# Altium integrated library WCAP-ATUL_rev15a.intlib: 117 symbols (part 1 of 2)
Pins are listed as number, name and electrical type; pins without a type are passive.

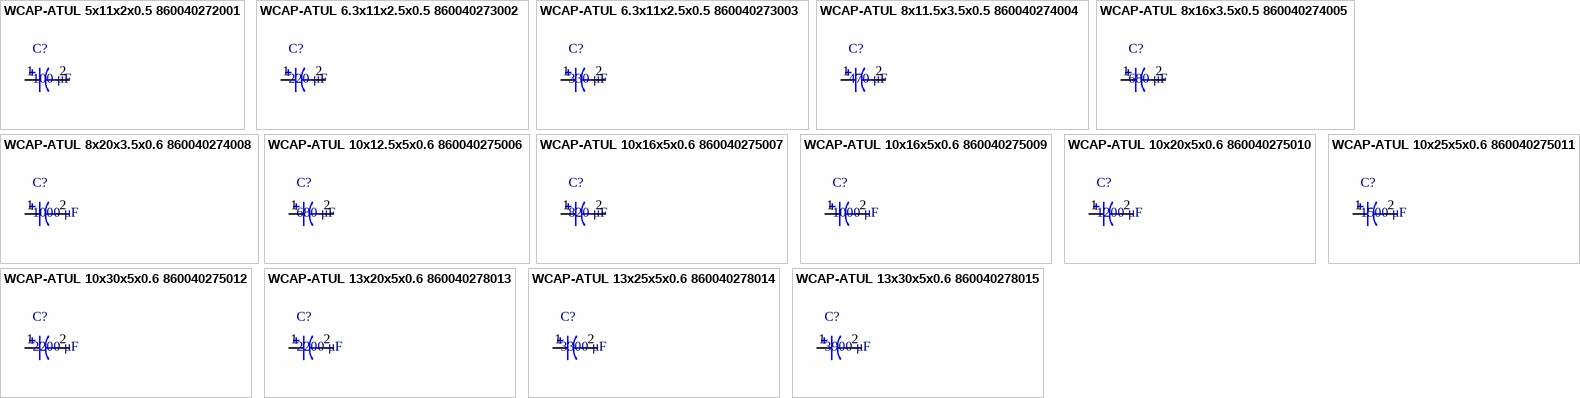
[diagram p0: symbols WCAP-ATUL 5x11x2x0.5 860040272001 to WCAP-ATUL 13x30x5x0.6 860040278015]

## WCAP-ATUL 5x11x2x0.5 860040272001
designator C?, comment 100 μF
WCAP-ATUL Aluminum Electrolytic Capacitors , 100 μF; + / - 20%; 10 V , 5 x 11; Manufacturer: Wurth Elektronik; partNo: 860040272001; E-mail: libraries@we-online.com; Characteristics: Aluminum Electrolytic Capacitor;Recommended soldering: Wave;Operating temperature: –40 °C to +105 °C;Minimized ESR and long life product series;Load life: 4000–10000 h @ +105 °C; ComponentLink1Description: Manufacturer; ComponentLink1URL: http://www.we-online.com; ComponentLink2Description: Datasheet; ComponentLink2URL: http://katalog.we-online.de/pbs/datasheet/860040272001.pdf; Created by: Karrer Zheng; Created Date: 5/13/2015; Capacitance: 100 μF; Application: Applied to high frequency secondary side output filter loop, general switching power supply, DC-DC converter, AC-DC converter, adapter, charger, TV, VCR, DC motor circuit filter, LCD TV digital audio, digital TV, digital camera, digital video camera, satellite receiver and etc.
footprint WCAP-ATUL 5x11x2x0.5
pins: 1, 2

## WCAP-ATUL 6.3x11x2.5x0.5 860040273002
designator C?, comment 220 μF
WCAP-ATUL Aluminum Electrolytic Capacitors , 220 μF; + / - 20%; 10 V , 6,3 x 11; Manufacturer: Wurth Elektronik; partNo: 860040273002; E-mail: libraries@we-online.com; Characteristics: Aluminum Electrolytic Capacitor;Recommended soldering: Wave;Operating temperature: –40 °C to +105 °C;Minimized ESR and long life product series;Load life: 4000–10000 h @ +105 °C; ComponentLink1Description: Manufacturer; ComponentLink1URL: http://www.we-online.com; ComponentLink2Description: Datasheet; ComponentLink2URL: http://katalog.we-online.de/pbs/datasheet/860040273002.pdf; Created by: Karrer Zheng; Created Date: 5/13/2015; Capacitance: 220 μF; Application: Applied to high frequency secondary side output filter loop, general switching power supply, DC-DC converter, AC-DC converter, adapter, charger, TV, VCR, DC motor circuit filter, LCD TV digital audio, digital TV, digital camera, digital video camera, satellite receiver and etc.
footprint WCAP-ATUL 6.3x11x2.5x0.5
pins: 1, 2

## WCAP-ATUL 6.3x11x2.5x0.5 860040273003
designator C?, comment 330 μF
WCAP-ATUL Aluminum Electrolytic Capacitors , 330 μF; + / - 20%; 10 V , 6,3 x 11; Manufacturer: Wurth Elektronik; partNo: 860040273003; E-mail: libraries@we-online.com; Characteristics: Aluminum Electrolytic Capacitor;Recommended soldering: Wave;Operating temperature: –40 °C to +105 °C;Minimized ESR and long life product series;Load life: 4000–10000 h @ +105 °C; ComponentLink1Description: Manufacturer; ComponentLink1URL: http://www.we-online.com; ComponentLink2Description: Datasheet; ComponentLink2URL: http://katalog.we-online.de/pbs/datasheet/860040273003.pdf; Created by: Karrer Zheng; Created Date: 5/13/2015; Capacitance: 330 μF; Application: Applied to high frequency secondary side output filter loop, general switching power supply, DC-DC converter, AC-DC converter, adapter, charger, TV, VCR, DC motor circuit filter, LCD TV digital audio, digital TV, digital camera, digital video camera, satellite receiver and etc.
footprint WCAP-ATUL 6.3x11x2.5x0.5
pins: 1, 2

## WCAP-ATUL 8x11.5x3.5x0.5 860040274004
designator C?, comment 470 μF
WCAP-ATUL Aluminum Electrolytic Capacitors , 470 μF; + / - 20%; 10 V , 8 x 11,5; Manufacturer: Wurth Elektronik; partNo: 860040274004; E-mail: libraries@we-online.com; Characteristics: Aluminum Electrolytic Capacitor;Recommended soldering: Wave;Operating temperature: –40 °C to +105 °C;Minimized ESR and long life product series;Load life: 4000–10000 h @ +105 °C; ComponentLink1Description: Manufacturer; ComponentLink1URL: http://www.we-online.com; ComponentLink2Description: Datasheet; ComponentLink2URL: http://katalog.we-online.de/pbs/datasheet/860040274004.pdf; Created by: Karrer Zheng; Created Date: 5/13/2015; Capacitance: 470 μF; Application: Applied to high frequency secondary side output filter loop, general switching power supply, DC-DC converter, AC-DC converter, adapter, charger, TV, VCR, DC motor circuit filter, LCD TV digital audio, digital TV, digital camera, digital video camera, satellite receiver and etc.
footprint WCAP-ATUL 8x11.5x3.5x0.5
pins: 1, 2

## WCAP-ATUL 8x16x3.5x0.5 860040274005
designator C?, comment 680 μF
WCAP-ATUL Aluminum Electrolytic Capacitors , 680 μF; + / - 20%; 10 V , 8 x 16; Manufacturer: Wurth Elektronik; partNo: 860040274005; E-mail: libraries@we-online.com; Characteristics: Aluminum Electrolytic Capacitor;Recommended soldering: Wave;Operating temperature: –40 °C to +105 °C;Minimized ESR and long life product series;Load life: 4000–10000 h @ +105 °C; ComponentLink1Description: Manufacturer; ComponentLink1URL: http://www.we-online.com; ComponentLink2Description: Datasheet; ComponentLink2URL: http://katalog.we-online.de/pbs/datasheet/860040274005.pdf; Created by: Karrer Zheng; Created Date: 5/13/2015; Capacitance: 680 μF; Application: Applied to high frequency secondary side output filter loop, general switching power supply, DC-DC converter, AC-DC converter, adapter, charger, TV, VCR, DC motor circuit filter, LCD TV digital audio, digital TV, digital camera, digital video camera, satellite receiver and etc.
footprint WCAP-ATUL 8x16x3.5x0.5
pins: 1, 2

## WCAP-ATUL 8x20x3.5x0.6 860040274008
designator C?, comment 1000 μF
WCAP-ATUL Aluminum Electrolytic Capacitors , 1000 μF; + / - 20%; 10 V , 8 x 20; Manufacturer: Wurth Elektronik; partNo: 860040274008; E-mail: libraries@we-online.com; Characteristics: Aluminum Electrolytic Capacitor;Recommended soldering: Wave;Operating temperature: –40 °C to +105 °C;Minimized ESR and long life product series;Load life: 4000–10000 h @ +105 °C; ComponentLink1Description: Manufacturer; ComponentLink1URL: http://www.we-online.com; ComponentLink2Description: Datasheet; ComponentLink2URL: http://katalog.we-online.de/pbs/datasheet/860040274008.pdf; Created by: Karrer Zheng; Created Date: 5/13/2015; Capacitance: 1000 μF; Application: Applied to high frequency secondary side output filter loop, general switching power supply, DC-DC converter, AC-DC converter, adapter, charger, TV, VCR, DC motor circuit filter, LCD TV digital audio, digital TV, digital camera, digital video camera, satellite receiver and etc.
footprint WCAP-ATUL 8x20x3.5x0.6
pins: 1, 2

## WCAP-ATUL 10x12.5x5x0.6 860040275006
designator C?, comment 680 μF
WCAP-ATUL Aluminum Electrolytic Capacitors , 680 μF; + / - 20%; 10 V , 10 x 12,5; Manufacturer: Wurth Elektronik; partNo: 860040275006; E-mail: libraries@we-online.com; Characteristics: Aluminum Electrolytic Capacitor;Recommended soldering: Wave;Operating temperature: –40 °C to +105 °C;Minimized ESR and long life product series;Load life: 4000–10000 h @ +105 °C; ComponentLink1Description: Manufacturer; ComponentLink1URL: http://www.we-online.com; ComponentLink2Description: Datasheet; ComponentLink2URL: http://katalog.we-online.de/pbs/datasheet/860040275006.pdf; Created by: Karrer Zheng; Created Date: 5/13/2015; Capacitance: 680 μF; Application: Applied to high frequency secondary side output filter loop, general switching power supply, DC-DC converter, AC-DC converter, adapter, charger, TV, VCR, DC motor circuit filter, LCD TV digital audio, digital TV, digital camera, digital video camera, satellite receiver and etc.
footprint WCAP-ATUL 10x12.5x5x0.6
pins: 1, 2

## WCAP-ATUL 10x16x5x0.6 860040275007
designator C?, comment 820 μF
WCAP-ATUL Aluminum Electrolytic Capacitors , 820 μF; + / - 20%; 10 V , 10 x 16; Manufacturer: Wurth Elektronik; partNo: 860040275007; E-mail: libraries@we-online.com; Characteristics: Aluminum Electrolytic Capacitor;Recommended soldering: Wave;Operating temperature: –40 °C to +105 °C;Minimized ESR and long life product series;Load life: 4000–10000 h @ +105 °C; ComponentLink1Description: Manufacturer; ComponentLink1URL: http://www.we-online.com; ComponentLink2Description: Datasheet; ComponentLink2URL: http://katalog.we-online.de/pbs/datasheet/860040275007.pdf; Created by: Karrer Zheng; Created Date: 5/13/2015; Capacitance: 820 μF; Application: Applied to high frequency secondary side output filter loop, general switching power supply, DC-DC converter, AC-DC converter, adapter, charger, TV, VCR, DC motor circuit filter, LCD TV digital audio, digital TV, digital camera, digital video camera, satellite receiver and etc.
footprint WCAP-ATUL 10x16x5x0.6
pins: 1, 2

## WCAP-ATUL 10x16x5x0.6 860040275009
designator C?, comment 1000 μF
WCAP-ATUL Aluminum Electrolytic Capacitors , 1000 μF; + / - 20%; 10 V , 10 x 16; Manufacturer: Wurth Elektronik; partNo: 860040275009; E-mail: libraries@we-online.com; Characteristics: Aluminum Electrolytic Capacitor;Recommended soldering: Wave;Operating temperature: –40 °C to +105 °C;Minimized ESR and long life product series;Load life: 4000–10000 h @ +105 °C; ComponentLink1Description: Manufacturer; ComponentLink1URL: http://www.we-online.com; ComponentLink2Description: Datasheet; ComponentLink2URL: http://katalog.we-online.de/pbs/datasheet/860040275009.pdf; Created by: Karrer Zheng; Created Date: 5/13/2015; Capacitance: 1000 μF; Application: Applied to high frequency secondary side output filter loop, general switching power supply, DC-DC converter, AC-DC converter, adapter, charger, TV, VCR, DC motor circuit filter, LCD TV digital audio, digital TV, digital camera, digital video camera, satellite receiver and etc.
footprint WCAP-ATUL 10x16x5x0.6
pins: 1, 2

## WCAP-ATUL 10x20x5x0.6 860040275010
designator C?, comment 1200 μF
WCAP-ATUL Aluminum Electrolytic Capacitors , 1200 μF; + / - 20%; 10 V , 10 x 20; Manufacturer: Wurth Elektronik; partNo: 860040275010; E-mail: libraries@we-online.com; Characteristics: Aluminum Electrolytic Capacitor;Recommended soldering: Wave;Operating temperature: –40 °C to +105 °C;Minimized ESR and long life product series;Load life: 4000–10000 h @ +105 °C; ComponentLink1Description: Manufacturer; ComponentLink1URL: http://www.we-online.com; ComponentLink2Description: Datasheet; ComponentLink2URL: http://katalog.we-online.de/pbs/datasheet/860040275010.pdf; Created by: Karrer Zheng; Created Date: 5/13/2015; Capacitance: 1200 μF; Application: Applied to high frequency secondary side output filter loop, general switching power supply, DC-DC converter, AC-DC converter, adapter, charger, TV, VCR, DC motor circuit filter, LCD TV digital audio, digital TV, digital camera, digital video camera, satellite receiver and etc.
footprint WCAP-ATUL 10x20x5x0.6
pins: 1, 2

## WCAP-ATUL 10x25x5x0.6 860040275011
designator C?, comment 1500 μF
WCAP-ATUL Aluminum Electrolytic Capacitors , 1500 μF; + / - 20%; 10 V , 10 x 25; Manufacturer: Wurth Elektronik; partNo: 860040275011; E-mail: libraries@we-online.com; Characteristics: Aluminum Electrolytic Capacitor;Recommended soldering: Wave;Operating temperature: –40 °C to +105 °C;Minimized ESR and long life product series;Load life: 4000–10000 h @ +105 °C; ComponentLink1Description: Manufacturer; ComponentLink1URL: http://www.we-online.com; ComponentLink2Description: Datasheet; ComponentLink2URL: http://katalog.we-online.de/pbs/datasheet/860040275011.pdf; Created by: Karrer Zheng; Created Date: 5/13/2015; Capacitance: 1500 μF; Application: Applied to high frequency secondary side output filter loop, general switching power supply, DC-DC converter, AC-DC converter, adapter, charger, TV, VCR, DC motor circuit filter, LCD TV digital audio, digital TV, digital camera, digital video camera, satellite receiver and etc.
footprint WCAP-ATUL 10x25x5x0.6
pins: 1, 2

## WCAP-ATUL 10x30x5x0.6 860040275012
designator C?, comment 2200 μF
WCAP-ATUL Aluminum Electrolytic Capacitors , 2200 μF; + / - 20%; 10 V , 10 x 30; Manufacturer: Wurth Elektronik; partNo: 860040275012; E-mail: libraries@we-online.com; Characteristics: Aluminum Electrolytic Capacitor;Recommended soldering: Wave;Operating temperature: –40 °C to +105 °C;Minimized ESR and long life product series;Load life: 4000–10000 h @ +105 °C; ComponentLink1Description: Manufacturer; ComponentLink1URL: http://www.we-online.com; ComponentLink2Description: Datasheet; ComponentLink2URL: http://katalog.we-online.de/pbs/datasheet/860040275012.pdf; Created by: Karrer Zheng; Created Date: 5/13/2015; Capacitance: 2200 μF; Application: Applied to high frequency secondary side output filter loop, general switching power supply, DC-DC converter, AC-DC converter, adapter, charger, TV, VCR, DC motor circuit filter, LCD TV digital audio, digital TV, digital camera, digital video camera, satellite receiver and etc.
footprint WCAP-ATUL 10x30x5x0.6
pins: 1, 2

## WCAP-ATUL 13x20x5x0.6 860040278013
designator C?, comment 2200 μF
WCAP-ATUL Aluminum Electrolytic Capacitors , 2200 μF; + / - 20%; 10 V , 13 x 20; Manufacturer: Wurth Elektronik; partNo: 860040278013; E-mail: libraries@we-online.com; Characteristics: Aluminum Electrolytic Capacitor;Recommended soldering: Wave;Operating temperature: –40 °C to +105 °C;Minimized ESR and long life product series;Load life: 4000–10000 h @ +105 °C; ComponentLink1Description: Manufacturer; ComponentLink1URL: http://www.we-online.com; ComponentLink2Description: Datasheet; ComponentLink2URL: http://katalog.we-online.de/pbs/datasheet/860040278013.pdf; Created by: Karrer Zheng; Created Date: 5/13/2015; Capacitance: 2200 μF; Application: Applied to high frequency secondary side output filter loop, general switching power supply, DC-DC converter, AC-DC converter, adapter, charger, TV, VCR, DC motor circuit filter, LCD TV digital audio, digital TV, digital camera, digital video camera, satellite receiver and etc.
footprint WCAP-ATUL 13x20x5x0.6
pins: 1, 2

## WCAP-ATUL 13x25x5x0.6 860040278014
designator C?, comment 3300 μF
WCAP-ATUL Aluminum Electrolytic Capacitors , 3300 μF; + / - 20%; 10 V , 13 x 25; Manufacturer: Wurth Elektronik; partNo: 860040278014; E-mail: libraries@we-online.com; Characteristics: Aluminum Electrolytic Capacitor;Recommended soldering: Wave;Operating temperature: –40 °C to +105 °C;Minimized ESR and long life product series;Load life: 4000–10000 h @ +105 °C; ComponentLink1Description: Manufacturer; ComponentLink1URL: http://www.we-online.com; ComponentLink2Description: Datasheet; ComponentLink2URL: http://katalog.we-online.de/pbs/datasheet/860040278014.pdf; Created by: Karrer Zheng; Created Date: 5/13/2015; Capacitance: 3300 μF; Application: Applied to high frequency secondary side output filter loop, general switching power supply, DC-DC converter, AC-DC converter, adapter, charger, TV, VCR, DC motor circuit filter, LCD TV digital audio, digital TV, digital camera, digital video camera, satellite receiver and etc.
footprint WCAP-ATUL 13x25x5x0.6
pins: 1, 2

## WCAP-ATUL 13x30x5x0.6 860040278015
designator C?, comment 3900 μF
WCAP-ATUL Aluminum Electrolytic Capacitors , 3900 μF; + / - 20%; 10 V , 13 x 30; Manufacturer: Wurth Elektronik; partNo: 860040278015; E-mail: libraries@we-online.com; Characteristics: Aluminum Electrolytic Capacitor;Recommended soldering: Wave;Operating temperature: –40 °C to +105 °C;Minimized ESR and long life product series;Load life: 4000–10000 h @ +105 °C; ComponentLink1Description: Manufacturer; ComponentLink1URL: http://www.we-online.com; ComponentLink2Description: Datasheet; ComponentLink2URL: http://katalog.we-online.de/pbs/datasheet/860040278015.pdf; Created by: Karrer Zheng; Created Date: 5/13/2015; Capacitance: 3900 μF; Application: Applied to high frequency secondary side output filter loop, general switching power supply, DC-DC converter, AC-DC converter, adapter, charger, TV, VCR, DC motor circuit filter, LCD TV digital audio, digital TV, digital camera, digital video camera, satellite receiver and etc.
footprint WCAP-ATUL 13x30x5x0.6
pins: 1, 2


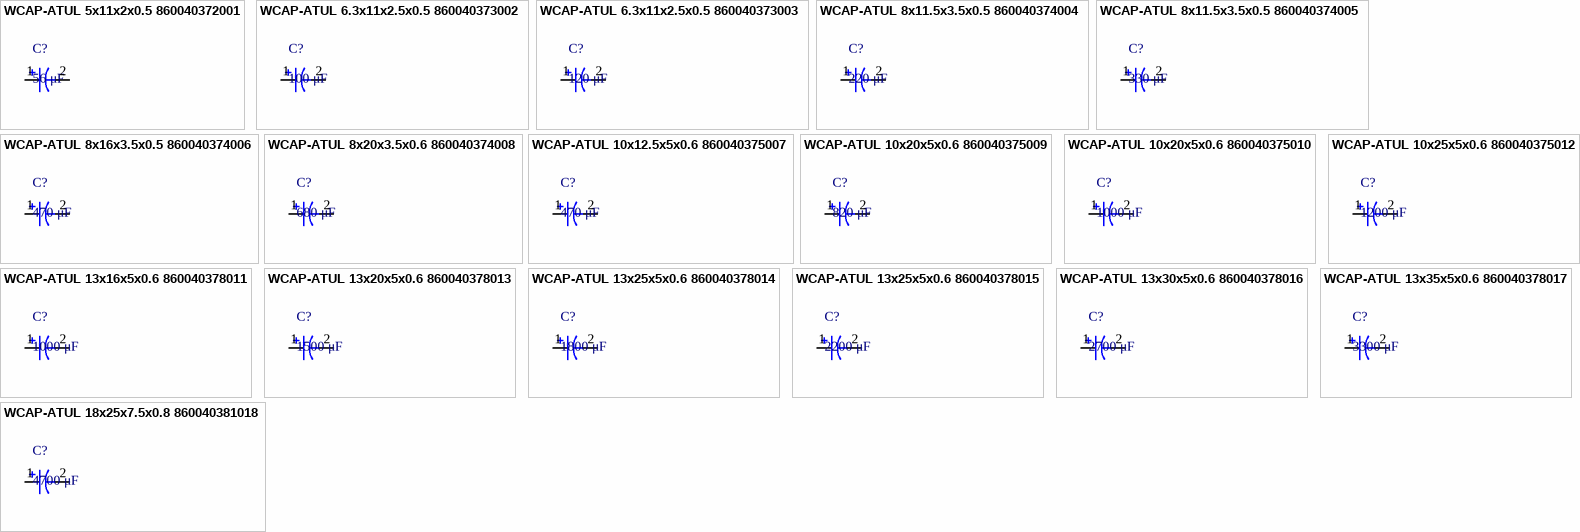
[diagram p1: symbols WCAP-ATUL 5x11x2x0.5 860040372001 to WCAP-ATUL 18x25x7.5x0.8 860040381018]

## WCAP-ATUL 5x11x2x0.5 860040372001
designator C?, comment 56 μF
WCAP-ATUL Aluminum Electrolytic Capacitors , 56 μF; + / - 20%; 16 V , 5 x 11; Manufacturer: Wurth Elektronik; partNo: 860040372001; E-mail: libraries@we-online.com; Characteristics: Aluminum Electrolytic Capacitor;Recommended soldering: Wave;Operating temperature: –40 °C to +105 °C;Minimized ESR and long life product series;Load life: 4000–10000 h @ +105 °C; ComponentLink1Description: Manufacturer; ComponentLink1URL: http://www.we-online.com; ComponentLink2Description: Datasheet; ComponentLink2URL: http://katalog.we-online.de/pbs/datasheet/860040372001.pdf; Created by: Karrer Zheng; Created Date: 5/13/2015; Capacitance: 56 μF; Application: Applied to high frequency secondary side output filter loop, general switching power supply, DC-DC converter, AC-DC converter, adapter, charger, TV, VCR, DC motor circuit filter, LCD TV digital audio, digital TV, digital camera, digital video camera, satellite receiver and etc.
footprint WCAP-ATUL 5x11x2x0.5
pins: 1, 2

## WCAP-ATUL 6.3x11x2.5x0.5 860040373002
designator C?, comment 100 μF
WCAP-ATUL Aluminum Electrolytic Capacitors , 100 μF; + / - 20%; 16 V , 6,3 x 11; Manufacturer: Wurth Elektronik; partNo: 860040373002; E-mail: libraries@we-online.com; Characteristics: Aluminum Electrolytic Capacitor;Recommended soldering: Wave;Operating temperature: –40 °C to +105 °C;Minimized ESR and long life product series;Load life: 4000–10000 h @ +105 °C; ComponentLink1Description: Manufacturer; ComponentLink1URL: http://www.we-online.com; ComponentLink2Description: Datasheet; ComponentLink2URL: http://katalog.we-online.de/pbs/datasheet/860040373002.pdf; Created by: Karrer Zheng; Created Date: 5/13/2015; Capacitance: 100 μF; Application: Applied to high frequency secondary side output filter loop, general switching power supply, DC-DC converter, AC-DC converter, adapter, charger, TV, VCR, DC motor circuit filter, LCD TV digital audio, digital TV, digital camera, digital video camera, satellite receiver and etc.
footprint WCAP-ATUL 6.3x11x2.5x0.5
pins: 1, 2

## WCAP-ATUL 6.3x11x2.5x0.5 860040373003
designator C?, comment 120 μF
WCAP-ATUL Aluminum Electrolytic Capacitors , 120 μF; + / - 20%; 16 V , 6,3 x 11; Manufacturer: Wurth Elektronik; partNo: 860040373003; E-mail: libraries@we-online.com; Characteristics: Aluminum Electrolytic Capacitor;Recommended soldering: Wave;Operating temperature: –40 °C to +105 °C;Minimized ESR and long life product series;Load life: 4000–10000 h @ +105 °C; ComponentLink1Description: Manufacturer; ComponentLink1URL: http://www.we-online.com; ComponentLink2Description: Datasheet; ComponentLink2URL: http://katalog.we-online.de/pbs/datasheet/860040373003.pdf; Created by: Karrer Zheng; Created Date: 5/13/2015; Capacitance: 120 μF; Application: Applied to high frequency secondary side output filter loop, general switching power supply, DC-DC converter, AC-DC converter, adapter, charger, TV, VCR, DC motor circuit filter, LCD TV digital audio, digital TV, digital camera, digital video camera, satellite receiver and etc.
footprint WCAP-ATUL 6.3x11x2.5x0.5
pins: 1, 2

## WCAP-ATUL 8x11.5x3.5x0.5 860040374004
designator C?, comment 220 μF
WCAP-ATUL Aluminum Electrolytic Capacitors , 220 μF; + / - 20%; 16 V , 8 x 11,5; Manufacturer: Wurth Elektronik; partNo: 860040374004; E-mail: libraries@we-online.com; Characteristics: Aluminum Electrolytic Capacitor;Recommended soldering: Wave;Operating temperature: –40 °C to +105 °C;Minimized ESR and long life product series;Load life: 4000–10000 h @ +105 °C; ComponentLink1Description: Manufacturer; ComponentLink1URL: http://www.we-online.com; ComponentLink2Description: Datasheet; ComponentLink2URL: http://katalog.we-online.de/pbs/datasheet/860040374004.pdf; Created by: Karrer Zheng; Created Date: 5/13/2015; Capacitance: 220 μF; Application: Applied to high frequency secondary side output filter loop, general switching power supply, DC-DC converter, AC-DC converter, adapter, charger, TV, VCR, DC motor circuit filter, LCD TV digital audio, digital TV, digital camera, digital video camera, satellite receiver and etc.
footprint WCAP-ATUL 8x11.5x3.5x0.5
pins: 1, 2

## WCAP-ATUL 8x11.5x3.5x0.5 860040374005
designator C?, comment 330 μF
WCAP-ATUL Aluminum Electrolytic Capacitors , 330 μF; + / - 20%; 16 V , 8 x 11,5; Manufacturer: Wurth Elektronik; partNo: 860040374005; E-mail: libraries@we-online.com; Characteristics: Aluminum Electrolytic Capacitor;Recommended soldering: Wave;Operating temperature: –40 °C to +105 °C;Minimized ESR and long life product series;Load life: 4000–10000 h @ +105 °C; ComponentLink1Description: Manufacturer; ComponentLink1URL: http://www.we-online.com; ComponentLink2Description: Datasheet; ComponentLink2URL: http://katalog.we-online.de/pbs/datasheet/860040374005.pdf; Created by: Karrer Zheng; Created Date: 5/13/2015; Capacitance: 330 μF; Application: Applied to high frequency secondary side output filter loop, general switching power supply, DC-DC converter, AC-DC converter, adapter, charger, TV, VCR, DC motor circuit filter, LCD TV digital audio, digital TV, digital camera, digital video camera, satellite receiver and etc.
footprint WCAP-ATUL 8x11.5x3.5x0.5
pins: 1, 2

## WCAP-ATUL 8x16x3.5x0.5 860040374006
designator C?, comment 470 μF
WCAP-ATUL Aluminum Electrolytic Capacitors , 470 μF; + / - 20%; 16 V , 8 x 16; Manufacturer: Wurth Elektronik; partNo: 860040374006; E-mail: libraries@we-online.com; Characteristics: Aluminum Electrolytic Capacitor;Recommended soldering: Wave;Operating temperature: –40 °C to +105 °C;Minimized ESR and long life product series;Load life: 4000–10000 h @ +105 °C; ComponentLink1Description: Manufacturer; ComponentLink1URL: http://www.we-online.com; ComponentLink2Description: Datasheet; ComponentLink2URL: http://katalog.we-online.de/pbs/datasheet/860040374006.pdf; Created by: Karrer Zheng; Created Date: 5/13/2015; Capacitance: 470 μF; Application: Applied to high frequency secondary side output filter loop, general switching power supply, DC-DC converter, AC-DC converter, adapter, charger, TV, VCR, DC motor circuit filter, LCD TV digital audio, digital TV, digital camera, digital video camera, satellite receiver and etc.
footprint WCAP-ATUL 8x16x3.5x0.5
pins: 1, 2

## WCAP-ATUL 8x20x3.5x0.6 860040374008
designator C?, comment 680 μF
WCAP-ATUL Aluminum Electrolytic Capacitors , 680 μF; + / - 20%; 16 V , 8 x 20; Manufacturer: Wurth Elektronik; partNo: 860040374008; E-mail: libraries@we-online.com; Characteristics: Aluminum Electrolytic Capacitor;Recommended soldering: Wave;Operating temperature: –40 °C to +105 °C;Minimized ESR and long life product series;Load life: 4000–10000 h @ +105 °C; ComponentLink1Description: Manufacturer; ComponentLink1URL: http://www.we-online.com; ComponentLink2Description: Datasheet; ComponentLink2URL: http://katalog.we-online.de/pbs/datasheet/860040374008.pdf; Created by: Karrer Zheng; Created Date: 5/13/2015; Capacitance: 680 μF; Application: Applied to high frequency secondary side output filter loop, general switching power supply, DC-DC converter, AC-DC converter, adapter, charger, TV, VCR, DC motor circuit filter, LCD TV digital audio, digital TV, digital camera, digital video camera, satellite receiver and etc.
footprint WCAP-ATUL 8x20x3.5x0.6
pins: 1, 2

## WCAP-ATUL 10x12.5x5x0.6 860040375007
designator C?, comment 470 μF
WCAP-ATUL Aluminum Electrolytic Capacitors , 470 μF; + / - 20%; 16 V , 10 x 12,5; Manufacturer: Wurth Elektronik; partNo: 860040375007; E-mail: libraries@we-online.com; Characteristics: Aluminum Electrolytic Capacitor;Recommended soldering: Wave;Operating temperature: –40 °C to +105 °C;Minimized ESR and long life product series;Load life: 4000–10000 h @ +105 °C; ComponentLink1Description: Manufacturer; ComponentLink1URL: http://www.we-online.com; ComponentLink2Description: Datasheet; ComponentLink2URL: http://katalog.we-online.de/pbs/datasheet/860040375007.pdf; Created by: Karrer Zheng; Created Date: 5/13/2015; Capacitance: 470 μF; Application: Applied to high frequency secondary side output filter loop, general switching power supply, DC-DC converter, AC-DC converter, adapter, charger, TV, VCR, DC motor circuit filter, LCD TV digital audio, digital TV, digital camera, digital video camera, satellite receiver and etc.
footprint WCAP-ATUL 10x12.5x5x0.6
pins: 1, 2

## WCAP-ATUL 10x20x5x0.6 860040375009
designator C?, comment 820 μF
WCAP-ATUL Aluminum Electrolytic Capacitors , 820 μF; + / - 20%; 16 V , 10 x 20; Manufacturer: Wurth Elektronik; partNo: 860040375009; E-mail: libraries@we-online.com; Characteristics: Aluminum Electrolytic Capacitor;Recommended soldering: Wave;Operating temperature: –40 °C to +105 °C;Minimized ESR and long life product series;Load life: 4000–10000 h @ +105 °C; ComponentLink1Description: Manufacturer; ComponentLink1URL: http://www.we-online.com; ComponentLink2Description: Datasheet; ComponentLink2URL: http://katalog.we-online.de/pbs/datasheet/860040375009.pdf; Created by: Karrer Zheng; Created Date: 5/13/2015; Capacitance: 820 μF; Application: Applied to high frequency secondary side output filter loop, general switching power supply, DC-DC converter, AC-DC converter, adapter, charger, TV, VCR, DC motor circuit filter, LCD TV digital audio, digital TV, digital camera, digital video camera, satellite receiver and etc.
footprint WCAP-ATUL 10x20x5x0.6
pins: 1, 2

## WCAP-ATUL 10x20x5x0.6 860040375010
designator C?, comment 1000 μF
WCAP-ATUL Aluminum Electrolytic Capacitors , 1000 μF; + / - 20%; 16 V , 10 x 20; Manufacturer: Wurth Elektronik; partNo: 860040375010; E-mail: libraries@we-online.com; Characteristics: Aluminum Electrolytic Capacitor;Recommended soldering: Wave;Operating temperature: –40 °C to +105 °C;Minimized ESR and long life product series;Load life: 4000–10000 h @ +105 °C; ComponentLink1Description: Manufacturer; ComponentLink1URL: http://www.we-online.com; ComponentLink2Description: Datasheet; ComponentLink2URL: http://katalog.we-online.de/pbs/datasheet/860040375010.pdf; Created by: Karrer Zheng; Created Date: 5/13/2015; Capacitance: 1000 μF; Application: Applied to high frequency secondary side output filter loop, general switching power supply, DC-DC converter, AC-DC converter, adapter, charger, TV, VCR, DC motor circuit filter, LCD TV digital audio, digital TV, digital camera, digital video camera, satellite receiver and etc.
footprint WCAP-ATUL 10x20x5x0.6
pins: 1, 2

## WCAP-ATUL 10x25x5x0.6 860040375012
designator C?, comment 1200 μF
WCAP-ATUL Aluminum Electrolytic Capacitors , 1200 μF; + / - 20%; 16 V , 10 x 25; Manufacturer: Wurth Elektronik; partNo: 860040375012; E-mail: libraries@we-online.com; Characteristics: Aluminum Electrolytic Capacitor;Recommended soldering: Wave;Operating temperature: –40 °C to +105 °C;Minimized ESR and long life product series;Load life: 4000–10000 h @ +105 °C; ComponentLink1Description: Manufacturer; ComponentLink1URL: http://www.we-online.com; ComponentLink2Description: Datasheet; ComponentLink2URL: http://katalog.we-online.de/pbs/datasheet/860040375012.pdf; Created by: Karrer Zheng; Created Date: 5/13/2015; Capacitance: 1200 μF; Application: Applied to high frequency secondary side output filter loop, general switching power supply, DC-DC converter, AC-DC converter, adapter, charger, TV, VCR, DC motor circuit filter, LCD TV digital audio, digital TV, digital camera, digital video camera, satellite receiver and etc.
footprint WCAP-ATUL 10x25x5x0.6
pins: 1, 2

## WCAP-ATUL 13x16x5x0.6 860040378011
designator C?, comment 1000 μF
WCAP-ATUL Aluminum Electrolytic Capacitors , 1000 μF; + / - 20%; 16 V , 13 x 16; Manufacturer: Wurth Elektronik; partNo: 860040378011; E-mail: libraries@we-online.com; Characteristics: Aluminum Electrolytic Capacitor;Recommended soldering: Wave;Operating temperature: –40 °C to +105 °C;Minimized ESR and long life product series;Load life: 4000–10000 h @ +105 °C; ComponentLink1Description: Manufacturer; ComponentLink1URL: http://www.we-online.com; ComponentLink2Description: Datasheet; ComponentLink2URL: http://katalog.we-online.de/pbs/datasheet/860040378011.pdf; Created by: Karrer Zheng; Created Date: 5/13/2015; Capacitance: 1000 μF; Application: Applied to high frequency secondary side output filter loop, general switching power supply, DC-DC converter, AC-DC converter, adapter, charger, TV, VCR, DC motor circuit filter, LCD TV digital audio, digital TV, digital camera, digital video camera, satellite receiver and etc.
footprint WCAP-ATUL 13x16x5x0.6
pins: 1, 2

## WCAP-ATUL 13x20x5x0.6 860040378013
designator C?, comment 1500 μF
WCAP-ATUL Aluminum Electrolytic Capacitors , 1500 μF; + / - 20%; 16 V , 13 x 20; Manufacturer: Wurth Elektronik; partNo: 860040378013; E-mail: libraries@we-online.com; Characteristics: Aluminum Electrolytic Capacitor;Recommended soldering: Wave;Operating temperature: –40 °C to +105 °C;Minimized ESR and long life product series;Load life: 4000–10000 h @ +105 °C; ComponentLink1Description: Manufacturer; ComponentLink1URL: http://www.we-online.com; ComponentLink2Description: Datasheet; ComponentLink2URL: http://katalog.we-online.de/pbs/datasheet/860040378013.pdf; Created by: Karrer Zheng; Created Date: 5/13/2015; Capacitance: 1500 μF; Application: Applied to high frequency secondary side output filter loop, general switching power supply, DC-DC converter, AC-DC converter, adapter, charger, TV, VCR, DC motor circuit filter, LCD TV digital audio, digital TV, digital camera, digital video camera, satellite receiver and etc.
footprint WCAP-ATUL 13x20x5x0.6
pins: 1, 2

## WCAP-ATUL 13x25x5x0.6 860040378014
designator C?, comment 1800 μF
WCAP-ATUL Aluminum Electrolytic Capacitors , 1800 μF; + / - 20%; 16 V , 13 x 25; Manufacturer: Wurth Elektronik; partNo: 860040378014; E-mail: libraries@we-online.com; Characteristics: Aluminum Electrolytic Capacitor;Recommended soldering: Wave;Operating temperature: –40 °C to +105 °C;Minimized ESR and long life product series;Load life: 4000–10000 h @ +105 °C; ComponentLink1Description: Manufacturer; ComponentLink1URL: http://www.we-online.com; ComponentLink2Description: Datasheet; ComponentLink2URL: http://katalog.we-online.de/pbs/datasheet/860040378014.pdf; Created by: Karrer Zheng; Created Date: 5/13/2015; Capacitance: 1800 μF; Application: Applied to high frequency secondary side output filter loop, general switching power supply, DC-DC converter, AC-DC converter, adapter, charger, TV, VCR, DC motor circuit filter, LCD TV digital audio, digital TV, digital camera, digital video camera, satellite receiver and etc.
footprint WCAP-ATUL 13x25x5x0.6
pins: 1, 2

## WCAP-ATUL 13x25x5x0.6 860040378015
designator C?, comment 2200 μF
WCAP-ATUL Aluminum Electrolytic Capacitors , 2200 μF; + / - 20%; 16 V , 13 x 25; Manufacturer: Wurth Elektronik; partNo: 860040378015; E-mail: libraries@we-online.com; Characteristics: Aluminum Electrolytic Capacitor;Recommended soldering: Wave;Operating temperature: –40 °C to +105 °C;Minimized ESR and long life product series;Load life: 4000–10000 h @ +105 °C; ComponentLink1Description: Manufacturer; ComponentLink1URL: http://www.we-online.com; ComponentLink2Description: Datasheet; ComponentLink2URL: http://katalog.we-online.de/pbs/datasheet/860040378015.pdf; Created by: Karrer Zheng; Created Date: 5/13/2015; Capacitance: 2200 μF; Application: Applied to high frequency secondary side output filter loop, general switching power supply, DC-DC converter, AC-DC converter, adapter, charger, TV, VCR, DC motor circuit filter, LCD TV digital audio, digital TV, digital camera, digital video camera, satellite receiver and etc.
footprint WCAP-ATUL 13x25x5x0.6
pins: 1, 2

## WCAP-ATUL 13x30x5x0.6 860040378016
designator C?, comment 2700 μF
WCAP-ATUL Aluminum Electrolytic Capacitors , 2700 μF; + / - 20%; 16 V , 13 x 30; Manufacturer: Wurth Elektronik; partNo: 860040378016; E-mail: libraries@we-online.com; Characteristics: Aluminum Electrolytic Capacitor;Recommended soldering: Wave;Operating temperature: –40 °C to +105 °C;Minimized ESR and long life product series;Load life: 4000–10000 h @ +105 °C; ComponentLink1Description: Manufacturer; ComponentLink1URL: http://www.we-online.com; ComponentLink2Description: Datasheet; ComponentLink2URL: http://katalog.we-online.de/pbs/datasheet/860040378016.pdf; Created by: Karrer Zheng; Created Date: 5/13/2015; Capacitance: 2700 μF; Application: Applied to high frequency secondary side output filter loop, general switching power supply, DC-DC converter, AC-DC converter, adapter, charger, TV, VCR, DC motor circuit filter, LCD TV digital audio, digital TV, digital camera, digital video camera, satellite receiver and etc.
footprint WCAP-ATUL 13x30x5x0.6
pins: 1, 2

## WCAP-ATUL 13x35x5x0.6 860040378017
designator C?, comment 3300 μF
WCAP-ATUL Aluminum Electrolytic Capacitors , 3300 μF; + / - 20%; 16 V , 13 x 35; Manufacturer: Wurth Elektronik; partNo: 860040378017; E-mail: libraries@we-online.com; Characteristics: Aluminum Electrolytic Capacitor;Recommended soldering: Wave;Operating temperature: –40 °C to +105 °C;Minimized ESR and long life product series;Load life: 4000–10000 h @ +105 °C; ComponentLink1Description: Manufacturer; ComponentLink1URL: http://www.we-online.com; ComponentLink2Description: Datasheet; ComponentLink2URL: http://katalog.we-online.de/pbs/datasheet/860040378017.pdf; Created by: Karrer Zheng; Created Date: 5/13/2015; Capacitance: 3300 μF; Application: Applied to high frequency secondary side output filter loop, general switching power supply, DC-DC converter, AC-DC converter, adapter, charger, TV, VCR, DC motor circuit filter, LCD TV digital audio, digital TV, digital camera, digital video camera, satellite receiver and etc.
footprint WCAP-ATUL 13x35x5x0.6
pins: 1, 2

## WCAP-ATUL 18x25x7.5x0.8 860040381018
designator C?, comment 4700 μF
WCAP-ATUL Aluminum Electrolytic Capacitors , 4700 μF; + / - 20%; 16 V , 18 x 25; Manufacturer: Wurth Elektronik; partNo: 860040381018; E-mail: libraries@we-online.com; Characteristics: Aluminum Electrolytic Capacitor;Recommended soldering: Wave;Operating temperature: –40 °C to +105 °C;Minimized ESR and long life product series;Load life: 4000–10000 h @ +105 °C; ComponentLink1Description: Manufacturer; ComponentLink1URL: http://www.we-online.com; ComponentLink2Description: Datasheet; ComponentLink2URL: http://katalog.we-online.de/pbs/datasheet/860040381018.pdf; Created by: Karrer Zheng; Created Date: 5/13/2015; Capacitance: 4700 μF; Application: Applied to high frequency secondary side output filter loop, general switching power supply, DC-DC converter, AC-DC converter, adapter, charger, TV, VCR, DC motor circuit filter, LCD TV digital audio, digital TV, digital camera, digital video camera, satellite receiver and etc.
footprint WCAP-ATUL 18x25x7.5x0.8
pins: 1, 2


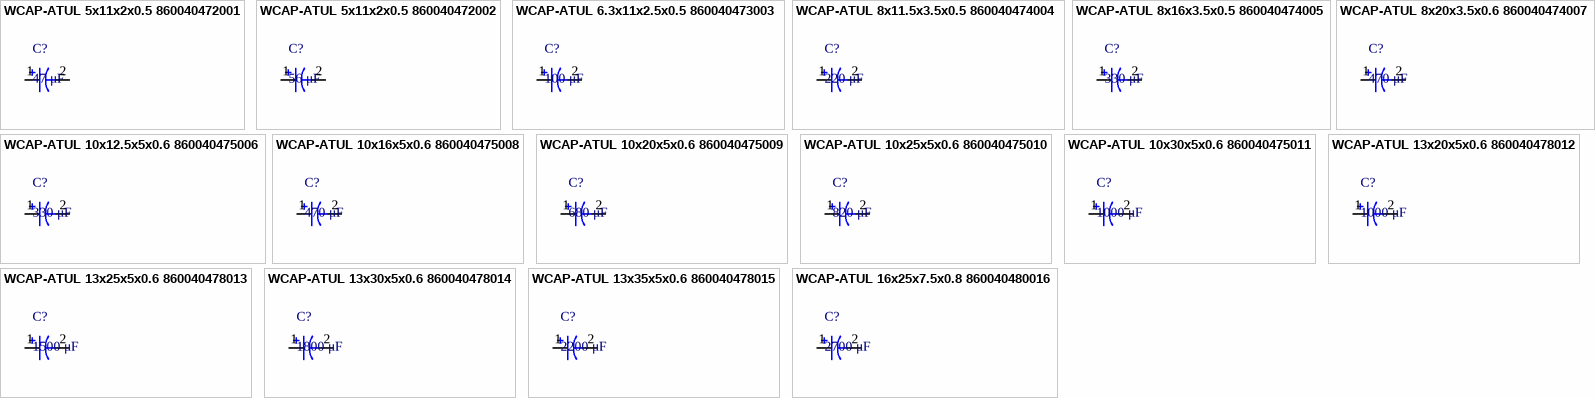
[diagram p2: symbols WCAP-ATUL 5x11x2x0.5 860040472001 to WCAP-ATUL 16x25x7.5x0.8 860040480016]

## WCAP-ATUL 5x11x2x0.5 860040472001
designator C?, comment 47 μF
WCAP-ATUL Aluminum Electrolytic Capacitors , 47 μF; + / - 20%; 25 V , 5 x 11; Manufacturer: Wurth Elektronik; partNo: 860040472001; E-mail: libraries@we-online.com; Characteristics: Aluminum Electrolytic Capacitor;Recommended soldering: Wave;Operating temperature: –40 °C to +105 °C;Minimized ESR and long life product series;Load life: 4000–10000 h @ +105 °C; ComponentLink1Description: Manufacturer; ComponentLink1URL: http://www.we-online.com; ComponentLink2Description: Datasheet; ComponentLink2URL: http://katalog.we-online.de/pbs/datasheet/860040472001.pdf; Created by: Karrer Zheng; Created Date: 5/13/2015; Capacitance: 47 μF; Application: Applied to high frequency secondary side output filter loop, general switching power supply, DC-DC converter, AC-DC converter, adapter, charger, TV, VCR, DC motor circuit filter, LCD TV digital audio, digital TV, digital camera, digital video camera, satellite receiver and etc.
footprint WCAP-ATUL 5x11x2x0.5
pins: 1, 2

## WCAP-ATUL 5x11x2x0.5 860040472002
designator C?, comment 56 μF
WCAP-ATUL Aluminum Electrolytic Capacitors , 56 μF; + / - 20%; 25 V , 5 x 11; Manufacturer: Wurth Elektronik; partNo: 860040472002; E-mail: libraries@we-online.com; Characteristics: Aluminum Electrolytic Capacitor;Recommended soldering: Wave;Operating temperature: –40 °C to +105 °C;Minimized ESR and long life product series;Load life: 4000–10000 h @ +105 °C; ComponentLink1Description: Manufacturer; ComponentLink1URL: http://www.we-online.com; ComponentLink2Description: Datasheet; ComponentLink2URL: http://katalog.we-online.de/pbs/datasheet/860040472002.pdf; Created by: Karrer Zheng; Created Date: 5/13/2015; Capacitance: 56 μF; Application: Applied to high frequency secondary side output filter loop, general switching power supply, DC-DC converter, AC-DC converter, adapter, charger, TV, VCR, DC motor circuit filter, LCD TV digital audio, digital TV, digital camera, digital video camera, satellite receiver and etc.
footprint WCAP-ATUL 5x11x2x0.5
pins: 1, 2

## WCAP-ATUL 6.3x11x2.5x0.5 860040473003
designator C?, comment 100 μF
WCAP-ATUL Aluminum Electrolytic Capacitors , 100 μF; + / - 20%; 25 V , 6,3 x 11; Manufacturer: Wurth Elektronik; partNo: 860040473003; E-mail: libraries@we-online.com; Characteristics: Aluminum Electrolytic Capacitor;Recommended soldering: Wave;Operating temperature: –40 °C to +105 °C;Minimized ESR and long life product series;Load life: 4000–10000 h @ +105 °C; ComponentLink1Description: Manufacturer; ComponentLink1URL: http://www.we-online.com; ComponentLink2Description: Datasheet; ComponentLink2URL: http://katalog.we-online.de/pbs/datasheet/860040473003.pdf; Created by: Karrer Zheng; Created Date: 5/13/2015; Capacitance: 100 μF; Application: Applied to high frequency secondary side output filter loop, general switching power supply, DC-DC converter, AC-DC converter, adapter, charger, TV, VCR, DC motor circuit filter, LCD TV digital audio, digital TV, digital camera, digital video camera, satellite receiver and etc.
footprint WCAP-ATUL 6.3x11x2.5x0.5
pins: 1, 2

## WCAP-ATUL 8x11.5x3.5x0.5 860040474004
designator C?, comment 220 μF
WCAP-ATUL Aluminum Electrolytic Capacitors , 220 μF; + / - 20%; 25 V , 8 x 11,5; Manufacturer: Wurth Elektronik; partNo: 860040474004; E-mail: libraries@we-online.com; Characteristics: Aluminum Electrolytic Capacitor;Recommended soldering: Wave;Operating temperature: –40 °C to +105 °C;Minimized ESR and long life product series;Load life: 4000–10000 h @ +105 °C; ComponentLink1Description: Manufacturer; ComponentLink1URL: http://www.we-online.com; ComponentLink2Description: Datasheet; ComponentLink2URL: http://katalog.we-online.de/pbs/datasheet/860040474004.pdf; Created by: Karrer Zheng; Created Date: 5/13/2015; Capacitance: 220 μF; Application: Applied to high frequency secondary side output filter loop, general switching power supply, DC-DC converter, AC-DC converter, adapter, charger, TV, VCR, DC motor circuit filter, LCD TV digital audio, digital TV, digital camera, digital video camera, satellite receiver and etc.
footprint WCAP-ATUL 8x11.5x3.5x0.5
pins: 1, 2

## WCAP-ATUL 8x16x3.5x0.5 860040474005
designator C?, comment 330 μF
WCAP-ATUL Aluminum Electrolytic Capacitors , 330 μF; + / - 20%; 25 V , 8 x 16; Manufacturer: Wurth Elektronik; partNo: 860040474005; E-mail: libraries@we-online.com; Characteristics: Aluminum Electrolytic Capacitor;Recommended soldering: Wave;Operating temperature: –40 °C to +105 °C;Minimized ESR and long life product series;Load life: 4000–10000 h @ +105 °C; ComponentLink1Description: Manufacturer; ComponentLink1URL: http://www.we-online.com; ComponentLink2Description: Datasheet; ComponentLink2URL: http://katalog.we-online.de/pbs/datasheet/860040474005.pdf; Created by: Karrer Zheng; Created Date: 5/13/2015; Capacitance: 330 μF; Application: Applied to high frequency secondary side output filter loop, general switching power supply, DC-DC converter, AC-DC converter, adapter, charger, TV, VCR, DC motor circuit filter, LCD TV digital audio, digital TV, digital camera, digital video camera, satellite receiver and etc.
footprint WCAP-ATUL 8x16x3.5x0.5
pins: 1, 2

## WCAP-ATUL 8x20x3.5x0.6 860040474007
designator C?, comment 470 μF
WCAP-ATUL Aluminum Electrolytic Capacitors , 470 μF; + / - 20%; 25 V , 8 x 20; Manufacturer: Wurth Elektronik; partNo: 860040474007; E-mail: libraries@we-online.com; Characteristics: Aluminum Electrolytic Capacitor;Recommended soldering: Wave;Operating temperature: –40 °C to +105 °C;Minimized ESR and long life product series;Load life: 4000–10000 h @ +105 °C; ComponentLink1Description: Manufacturer; ComponentLink1URL: http://www.we-online.com; ComponentLink2Description: Datasheet; ComponentLink2URL: http://katalog.we-online.de/pbs/datasheet/860040474007.pdf; Created by: Karrer Zheng; Created Date: 5/13/2015; Capacitance: 470 μF; Application: Applied to high frequency secondary side output filter loop, general switching power supply, DC-DC converter, AC-DC converter, adapter, charger, TV, VCR, DC motor circuit filter, LCD TV digital audio, digital TV, digital camera, digital video camera, satellite receiver and etc.
footprint WCAP-ATUL 8x20x3.5x0.6
pins: 1, 2

## WCAP-ATUL 10x12.5x5x0.6 860040475006
designator C?, comment 330 μF
WCAP-ATUL Aluminum Electrolytic Capacitors , 330 μF; + / - 20%; 25 V , 10 x 12,5; Manufacturer: Wurth Elektronik; partNo: 860040475006; E-mail: libraries@we-online.com; Characteristics: Aluminum Electrolytic Capacitor;Recommended soldering: Wave;Operating temperature: –40 °C to +105 °C;Minimized ESR and long life product series;Load life: 4000–10000 h @ +105 °C; ComponentLink1Description: Manufacturer; ComponentLink1URL: http://www.we-online.com; ComponentLink2Description: Datasheet; ComponentLink2URL: http://katalog.we-online.de/pbs/datasheet/860040475006.pdf; Created by: Karrer Zheng; Created Date: 5/13/2015; Capacitance: 330 μF; Application: Applied to high frequency secondary side output filter loop, general switching power supply, DC-DC converter, AC-DC converter, adapter, charger, TV, VCR, DC motor circuit filter, LCD TV digital audio, digital TV, digital camera, digital video camera, satellite receiver and etc.
footprint WCAP-ATUL 10x12.5x5x0.6
pins: 1, 2

## WCAP-ATUL 10x16x5x0.6 860040475008
designator C?, comment 470 μF
WCAP-ATUL Aluminum Electrolytic Capacitors , 470 μF; + / - 20%; 25 V , 10 x 16; Manufacturer: Wurth Elektronik; partNo: 860040475008; E-mail: libraries@we-online.com; Characteristics: Aluminum Electrolytic Capacitor;Recommended soldering: Wave;Operating temperature: –40 °C to +105 °C;Minimized ESR and long life product series;Load life: 4000–10000 h @ +105 °C; ComponentLink1Description: Manufacturer; ComponentLink1URL: http://www.we-online.com; ComponentLink2Description: Datasheet; ComponentLink2URL: http://katalog.we-online.de/pbs/datasheet/860040475008.pdf; Created by: Karrer Zheng; Created Date: 5/13/2015; Capacitance: 470 μF; Application: Applied to high frequency secondary side output filter loop, general switching power supply, DC-DC converter, AC-DC converter, adapter, charger, TV, VCR, DC motor circuit filter, LCD TV digital audio, digital TV, digital camera, digital video camera, satellite receiver and etc.
footprint WCAP-ATUL 10x16x5x0.6
pins: 1, 2

## WCAP-ATUL 10x20x5x0.6 860040475009
designator C?, comment 680 μF
WCAP-ATUL Aluminum Electrolytic Capacitors , 680 μF; + / - 20%; 25 V , 10 x 20; Manufacturer: Wurth Elektronik; partNo: 860040475009; E-mail: libraries@we-online.com; Characteristics: Aluminum Electrolytic Capacitor;Recommended soldering: Wave;Operating temperature: –40 °C to +105 °C;Minimized ESR and long life product series;Load life: 4000–10000 h @ +105 °C; ComponentLink1Description: Manufacturer; ComponentLink1URL: http://www.we-online.com; ComponentLink2Description: Datasheet; ComponentLink2URL: http://katalog.we-online.de/pbs/datasheet/860040475009.pdf; Created by: Karrer Zheng; Created Date: 5/13/2015; Capacitance: 680 μF; Application: Applied to high frequency secondary side output filter loop, general switching power supply, DC-DC converter, AC-DC converter, adapter, charger, TV, VCR, DC motor circuit filter, LCD TV digital audio, digital TV, digital camera, digital video camera, satellite receiver and etc.
footprint WCAP-ATUL 10x20x5x0.6
pins: 1, 2

## WCAP-ATUL 10x25x5x0.6 860040475010
designator C?, comment 820 μF
WCAP-ATUL Aluminum Electrolytic Capacitors , 820 μF; + / - 20%; 25 V , 10 x 25; Manufacturer: Wurth Elektronik; partNo: 860040475010; E-mail: libraries@we-online.com; Characteristics: Aluminum Electrolytic Capacitor;Recommended soldering: Wave;Operating temperature: –40 °C to +105 °C;Minimized ESR and long life product series;Load life: 4000–10000 h @ +105 °C; ComponentLink1Description: Manufacturer; ComponentLink1URL: http://www.we-online.com; ComponentLink2Description: Datasheet; ComponentLink2URL: http://katalog.we-online.de/pbs/datasheet/860040475010.pdf; Created by: Karrer Zheng; Created Date: 5/13/2015; Capacitance: 820 μF; Application: Applied to high frequency secondary side output filter loop, general switching power supply, DC-DC converter, AC-DC converter, adapter, charger, TV, VCR, DC motor circuit filter, LCD TV digital audio, digital TV, digital camera, digital video camera, satellite receiver and etc.
footprint WCAP-ATUL 10x25x5x0.6
pins: 1, 2

## WCAP-ATUL 10x30x5x0.6 860040475011
designator C?, comment 1000 μF
WCAP-ATUL Aluminum Electrolytic Capacitors , 1000 μF; + / - 20%; 25 V , 10 x 30; Manufacturer: Wurth Elektronik; partNo: 860040475011; E-mail: libraries@we-online.com; Characteristics: Aluminum Electrolytic Capacitor;Recommended soldering: Wave;Operating temperature: –40 °C to +105 °C;Minimized ESR and long life product series;Load life: 4000–10000 h @ +105 °C; ComponentLink1Description: Manufacturer; ComponentLink1URL: http://www.we-online.com; ComponentLink2Description: Datasheet; ComponentLink2URL: http://katalog.we-online.de/pbs/datasheet/860040475011.pdf; Created by: Karrer Zheng; Created Date: 5/13/2015; Capacitance: 1000 μF; Application: Applied to high frequency secondary side output filter loop, general switching power supply, DC-DC converter, AC-DC converter, adapter, charger, TV, VCR, DC motor circuit filter, LCD TV digital audio, digital TV, digital camera, digital video camera, satellite receiver and etc.
footprint WCAP-ATUL 10x30x5x0.6
pins: 1, 2

## WCAP-ATUL 13x20x5x0.6 860040478012
designator C?, comment 1000 μF
WCAP-ATUL Aluminum Electrolytic Capacitors , 1000 μF; + / - 20%; 25 V , 13 x 20; Manufacturer: Wurth Elektronik; partNo: 860040478012; E-mail: libraries@we-online.com; Characteristics: Aluminum Electrolytic Capacitor;Recommended soldering: Wave;Operating temperature: –40 °C to +105 °C;Minimized ESR and long life product series;Load life: 4000–10000 h @ +105 °C; ComponentLink1Description: Manufacturer; ComponentLink1URL: http://www.we-online.com; ComponentLink2Description: Datasheet; ComponentLink2URL: http://katalog.we-online.de/pbs/datasheet/860040478012.pdf; Created by: Karrer Zheng; Created Date: 5/13/2015; Capacitance: 1000 μF; Application: Applied to high frequency secondary side output filter loop, general switching power supply, DC-DC converter, AC-DC converter, adapter, charger, TV, VCR, DC motor circuit filter, LCD TV digital audio, digital TV, digital camera, digital video camera, satellite receiver and etc.
footprint WCAP-ATUL 13x20x5x0.6
pins: 1, 2

## WCAP-ATUL 13x25x5x0.6 860040478013
designator C?, comment 1500 μF
WCAP-ATUL Aluminum Electrolytic Capacitors , 1500 μF; + / - 20%; 25 V , 13 x 25; Manufacturer: Wurth Elektronik; partNo: 860040478013; E-mail: libraries@we-online.com; Characteristics: Aluminum Electrolytic Capacitor;Recommended soldering: Wave;Operating temperature: –40 °C to +105 °C;Minimized ESR and long life product series;Load life: 4000–10000 h @ +105 °C; ComponentLink1Description: Manufacturer; ComponentLink1URL: http://www.we-online.com; ComponentLink2Description: Datasheet; ComponentLink2URL: http://katalog.we-online.de/pbs/datasheet/860040478013.pdf; Created by: Karrer Zheng; Created Date: 5/13/2015; Capacitance: 1500 μF; Application: Applied to high frequency secondary side output filter loop, general switching power supply, DC-DC converter, AC-DC converter, adapter, charger, TV, VCR, DC motor circuit filter, LCD TV digital audio, digital TV, digital camera, digital video camera, satellite receiver and etc.
footprint WCAP-ATUL 13x25x5x0.6
pins: 1, 2

## WCAP-ATUL 13x30x5x0.6 860040478014
designator C?, comment 1800 μF
WCAP-ATUL Aluminum Electrolytic Capacitors , 1800 μF; + / - 20%; 25 V , 13 x 30; Manufacturer: Wurth Elektronik; partNo: 860040478014; E-mail: libraries@we-online.com; Characteristics: Aluminum Electrolytic Capacitor;Recommended soldering: Wave;Operating temperature: –40 °C to +105 °C;Minimized ESR and long life product series;Load life: 4000–10000 h @ +105 °C; ComponentLink1Description: Manufacturer; ComponentLink1URL: http://www.we-online.com; ComponentLink2Description: Datasheet; ComponentLink2URL: http://katalog.we-online.de/pbs/datasheet/860040478014.pdf; Created by: Karrer Zheng; Created Date: 5/13/2015; Capacitance: 1800 μF; Application: Applied to high frequency secondary side output filter loop, general switching power supply, DC-DC converter, AC-DC converter, adapter, charger, TV, VCR, DC motor circuit filter, LCD TV digital audio, digital TV, digital camera, digital video camera, satellite receiver and etc.
footprint WCAP-ATUL 13x30x5x0.6
pins: 1, 2

## WCAP-ATUL 13x35x5x0.6 860040478015
designator C?, comment 2200 μF
WCAP-ATUL Aluminum Electrolytic Capacitors , 2200 μF; + / - 20%; 25 V , 13 x 35; Manufacturer: Wurth Elektronik; partNo: 860040478015; E-mail: libraries@we-online.com; Characteristics: Aluminum Electrolytic Capacitor;Recommended soldering: Wave;Operating temperature: –40 °C to +105 °C;Minimized ESR and long life product series;Load life: 4000–10000 h @ +105 °C; ComponentLink1Description: Manufacturer; ComponentLink1URL: http://www.we-online.com; ComponentLink2Description: Datasheet; ComponentLink2URL: http://katalog.we-online.de/pbs/datasheet/860040478015.pdf; Created by: Karrer Zheng; Created Date: 5/13/2015; Capacitance: 2200 μF; Application: Applied to high frequency secondary side output filter loop, general switching power supply, DC-DC converter, AC-DC converter, adapter, charger, TV, VCR, DC motor circuit filter, LCD TV digital audio, digital TV, digital camera, digital video camera, satellite receiver and etc.
footprint WCAP-ATUL 13x35x5x0.6
pins: 1, 2

## WCAP-ATUL 16x25x7.5x0.8 860040480016
designator C?, comment 2700 μF
WCAP-ATUL Aluminum Electrolytic Capacitors , 2700 μF; + / - 20%; 25 V , 16 x 25; Manufacturer: Wurth Elektronik; partNo: 860040480016; E-mail: libraries@we-online.com; Characteristics: Aluminum Electrolytic Capacitor;Recommended soldering: Wave;Operating temperature: –40 °C to +105 °C;Minimized ESR and long life product series;Load life: 4000–10000 h @ +105 °C; ComponentLink1Description: Manufacturer; ComponentLink1URL: http://www.we-online.com; ComponentLink2Description: Datasheet; ComponentLink2URL: http://katalog.we-online.de/pbs/datasheet/860040480016.pdf; Created by: Karrer Zheng; Created Date: 5/13/2015; Capacitance: 2700 μF; Application: Applied to high frequency secondary side output filter loop, general switching power supply, DC-DC converter, AC-DC converter, adapter, charger, TV, VCR, DC motor circuit filter, LCD TV digital audio, digital TV, digital camera, digital video camera, satellite receiver and etc.
footprint WCAP-ATUL 16x25x7.5x0.8
pins: 1, 2


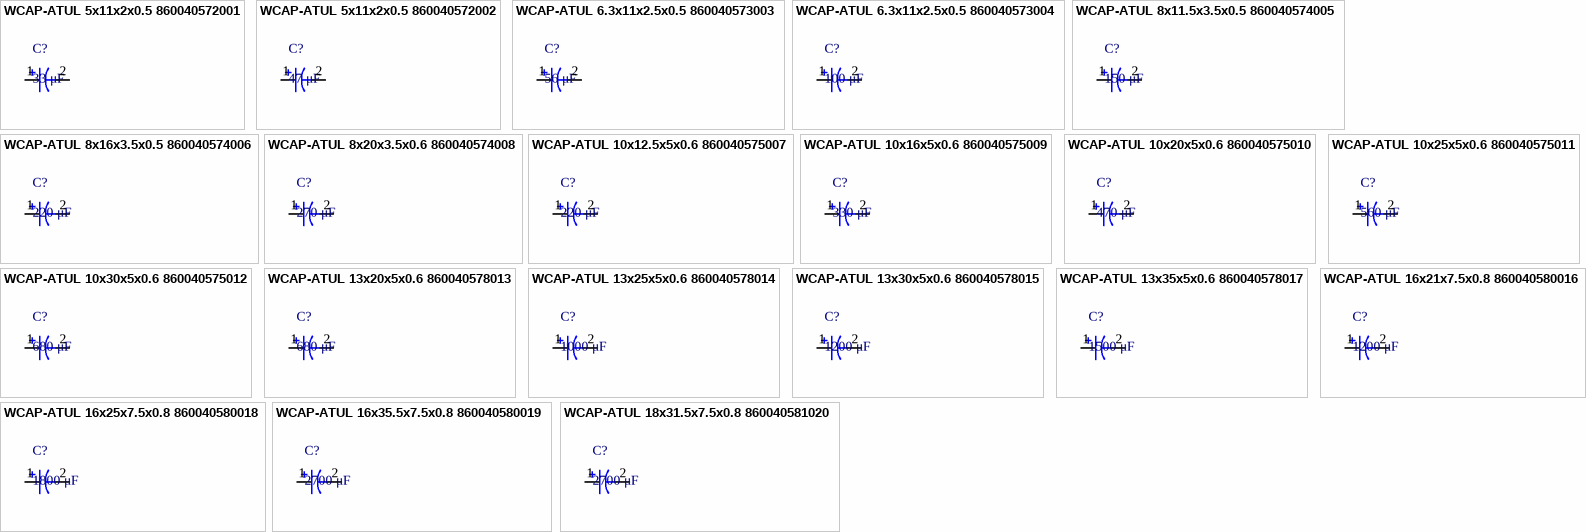
[diagram p3: symbols WCAP-ATUL 5x11x2x0.5 860040572001 to WCAP-ATUL 18x31.5x7.5x0.8 860040581020]
